# Altium footprint library texas.PCBLIB: 124 footprints (part 6 of 12) (continued)
## HTSSOP64DCA [mm] (continued)
  rectangle: 0.095,-4.305 0.405,-3.195
  rectangle: 0.595,-4.305 0.905,-3.195
  rectangle: 1.095,-4.305 1.405,-3.195
  rectangle: 1.595,-4.305 1.905,-3.195
  rectangle: 2.095,-4.305 2.405,-3.195
  rectangle: 2.595,-4.305 2.905,-3.195
  rectangle: 3.095,-4.305 3.405,-3.195
  rectangle: 3.595,-4.305 3.905,-3.195
  rectangle: 4.095,-4.305 4.405,-3.195
  rectangle: 4.595,-4.305 4.905,-3.195
  rectangle: 5.095,-4.305 5.405,-3.195
  rectangle: 5.595,-4.305 5.905,-3.195
  rectangle: 6.095,-4.305 6.405,-3.195
  rectangle: 6.595,-4.305 6.905,-3.195
  rectangle: 7.095,-4.305 7.405,-3.195
  rectangle: 7.595,-4.305 7.905,-3.195
  region: 7.905,4.305 7.595,4.305 7.595,3.195 7.905,3.195
  region: 7.405,4.305 7.095,4.305 7.095,3.195 7.405,3.195
  region: 6.905,4.305 6.595,4.305 6.595,3.195 6.905,3.195
  region: 6.405,4.305 6.095,4.305 6.095,3.195 6.405,3.195
  region: 5.905,4.305 5.595,4.305 5.595,3.195 5.905,3.195
  region: 5.405,4.305 5.095,4.305 5.095,3.195 5.405,3.195
  region: 4.905,4.305 4.595,4.305 4.595,3.195 4.905,3.195
  region: 4.405,4.305 4.095,4.305 4.095,3.195 4.405,3.195
  region: 3.905,4.305 3.595,4.305 3.595,3.195 3.905,3.195
  region: 3.405,4.305 3.095,4.305 3.095,3.195 3.405,3.195
  region: 2.905,4.305 2.595,4.305 2.595,3.195 2.905,3.195
  region: 2.405,4.305 2.095,4.305 2.095,3.195 2.405,3.195
  region: 1.905,4.305 1.595,4.305 1.595,3.195 1.905,3.195
  region: 1.405,4.305 1.095,4.305 1.095,3.195 1.405,3.195
  region: 0.905,4.305 0.595,4.305 0.595,3.195 0.905,3.195
  region: 0.405,4.305 0.095,4.305 0.095,3.195 0.405,3.195
  region: -0.095,4.305 -0.405,4.305 -0.405,3.195 -0.095,3.195
  region: -0.595,4.305 -0.905,4.305 -0.905,3.195 -0.595,3.195
  region: -1.095,4.305 -1.405,4.305 -1.405,3.195 -1.095,3.195
  region: -1.595,4.305 -1.905,4.305 -1.905,3.195 -1.595,3.195
  region: -2.095,4.305 -2.405,4.305 -2.405,3.195 -2.095,3.195
  region: -2.595,4.305 -2.905,4.305 -2.905,3.195 -2.595,3.195
  region: -3.095,4.305 -3.405,4.305 -3.405,3.195 -3.095,3.195
  region: -3.595,4.305 -3.905,4.305 -3.905,3.195 -3.595,3.195
  region: -4.095,4.305 -4.405,4.305 -4.405,3.195 -4.095,3.195
  region: -4.595,4.305 -4.905,4.305 -4.905,3.195 -4.595,3.195
  region: -5.095,4.305 -5.405,4.305 -5.405,3.195 -5.095,3.195
  region: -5.595,4.305 -5.905,4.305 -5.905,3.195 -5.595,3.195
  region: -6.095,4.305 -6.405,4.305 -6.405,3.195 -6.095,3.195
  region: -6.595,4.305 -6.905,4.305 -6.905,3.195 -6.595,3.195
  region: -7.095,4.305 -7.405,4.305 -7.405,3.195 -7.095,3.195
  region: -7.595,4.305 -7.905,4.305 -7.905,3.195 -7.595,3.195
  rectangle: -8.5,-2.55 8.5,2.54
Mechanical 2:
  circle w0.102: c-7.6,-2.2 r0.283
  lines w0.102: -8.5,-3.05 8.5,-3.05 8.5,3.05 -8.5,3.05 -8.5,-3.05
Mechanical 18:
  rectangle: -7.86,-4.15 -7.63,-3.095
  rectangle: -7.36,-4.15 -7.13,-3.095
  rectangle: -6.86,-4.15 -6.63,-3.095
  rectangle: -6.36,-4.15 -6.13,-3.095
  rectangle: -5.86,-4.15 -5.63,-3.095
  rectangle: -5.36,-4.15 -5.13,-3.095
  rectangle: -4.86,-4.15 -4.63,-3.095
  rectangle: -4.36,-4.15 -4.13,-3.095
  rectangle: -3.86,-4.15 -3.63,-3.095
  rectangle: -3.36,-4.15 -3.13,-3.095
  rectangle: -2.86,-4.15 -2.63,-3.095
  rectangle: -2.36,-4.15 -2.13,-3.095
  rectangle: -1.86,-4.15 -1.63,-3.095
  rectangle: -1.36,-4.15 -1.13,-3.095
  rectangle: -0.86,-4.15 -0.63,-3.095
  rectangle: -0.36,-4.15 -0.13,-3.095
  rectangle: 0.14,-4.15 0.37,-3.095
  rectangle: 0.64,-4.15 0.87,-3.095
  rectangle: 1.14,-4.15 1.37,-3.095
  rectangle: 1.64,-4.15 1.87,-3.095
  rectangle: 2.14,-4.15 2.37,-3.095
  rectangle: 2.64,-4.15 2.87,-3.095
  rectangle: 3.14,-4.15 3.37,-3.095
  rectangle: 3.64,-4.15 3.87,-3.095
  rectangle: 4.14,-4.15 4.37,-3.095
  rectangle: 4.64,-4.15 4.87,-3.095
  rectangle: 5.14,-4.15 5.37,-3.095
  rectangle: 5.64,-4.15 5.87,-3.095
  rectangle: 6.14,-4.15 6.37,-3.095
  rectangle: 6.64,-4.15 6.87,-3.095
  rectangle: 7.14,-4.15 7.37,-3.095
  rectangle: 7.64,-4.15 7.87,-3.095
  region: 7.86,4.15 7.63,4.15 7.63,3.095 7.86,3.095
  region: 7.36,4.15 7.13,4.15 7.13,3.095 7.36,3.095
  region: 6.86,4.15 6.63,4.15 6.63,3.095 6.86,3.095
  region: 6.36,4.15 6.13,4.15 6.13,3.095 6.36,3.095
  region: 5.86,4.15 5.63,4.15 5.63,3.095 5.86,3.095
  region: 5.36,4.15 5.13,4.15 5.13,3.095 5.36,3.095
  region: 4.86,4.15 4.63,4.15 4.63,3.095 4.86,3.095
  region: 4.36,4.15 4.13,4.15 4.13,3.095 4.36,3.095
  region: 3.86,4.15 3.63,4.15 3.63,3.095 3.86,3.095
  region: 3.36,4.15 3.13,4.15 3.13,3.095 3.36,3.095
  region: 2.86,4.15 2.63,4.15 2.63,3.095 2.86,3.095
  region: 2.36,4.15 2.13,4.15 2.13,3.095 2.36,3.095
  region: 1.86,4.15 1.63,4.15 1.63,3.095 1.86,3.095
  region: 1.36,4.15 1.13,4.15 1.13,3.095 1.36,3.095
  region: 0.86,4.15 0.63,4.15 0.63,3.095 0.86,3.095
  region: 0.36,4.15 0.13,4.15 0.13,3.095 0.36,3.095
  region: -0.14,4.15 -0.37,4.15 -0.37,3.095 -0.14,3.095
  region: -0.64,4.15 -0.87,4.15 -0.87,3.095 -0.64,3.095
  region: -1.14,4.15 -1.37,4.15 -1.37,3.095 -1.14,3.095
  region: -1.64,4.15 -1.87,4.15 -1.87,3.095 -1.64,3.095
  region: -2.14,4.15 -2.37,4.15 -2.37,3.095 -2.14,3.095
  region: -2.64,4.15 -2.87,4.15 -2.87,3.095 -2.64,3.095
  region: -3.14,4.15 -3.37,4.15 -3.37,3.095 -3.14,3.095
  region: -3.64,4.15 -3.87,4.15 -3.87,3.095 -3.64,3.095
  region: -4.14,4.15 -4.37,4.15 -4.37,3.095 -4.14,3.095
  region: -4.64,4.15 -4.87,4.15 -4.87,3.095 -4.64,3.095
  region: -5.14,4.15 -5.37,4.15 -5.37,3.095 -5.14,3.095
  region: -5.64,4.15 -5.87,4.15 -5.87,3.095 -5.64,3.095
  region: -6.14,4.15 -6.37,4.15 -6.37,3.095 -6.14,3.095
  region: -6.64,4.15 -6.87,4.15 -6.87,3.095 -6.64,3.095
  region: -7.14,4.15 -7.37,4.15 -7.37,3.095 -7.14,3.095
  region: -7.64,4.15 -7.87,4.15 -7.87,3.095 -7.64,3.095

## HTSSOP64DFD [mm]
pads (66):
  rect 0.3x1.1 smd paste-0.55 mask-0.55: 1(-7.75,-3.75) 2(-7.25,-3.75) 3(-6.75,-3.75) 4(-6.25,-3.75) 5(-5.75,-3.75) 6(-5.25,-3.75) 7(-4.75,-3.75) 8(-4.25,-3.75) 9(-3.75,-3.75) 10(-3.25,-3.75) 11(-2.75,-3.75) 12(-2.25,-3.75) 13(-1.75,-3.75) 14(-1.25,-3.75) 15(-0.75,-3.75) 16(-0.25,-3.75) 17(0.25,-3.75) 18(0.75,-3.75) 19(1.25,-3.75) 20(1.75,-3.75) 21(2.25,-3.75) 22(2.75,-3.75) 23(3.25,-3.75) 24(3.75,-3.75) 25(4.25,-3.75) 26(4.75,-3.75) 27(5.25,-3.75) 28(5.75,-3.75) 29(6.25,-3.75) 30(6.75,-3.75) 31(7.25,-3.75) 32(7.75,-3.75) 33(7.75,3.75) 34(7.25,3.75) 35(6.75,3.75) 36(6.25,3.75) 37(5.75,3.75) 38(5.25,3.75) 39(4.75,3.75) 40(4.25,3.75) 41(3.75,3.75) 42(3.25,3.75) 43(2.75,3.75) 44(2.25,3.75) 45(1.75,3.75) 46(1.25,3.75) 47(0.75,3.75) 48(0.25,3.75) 49(-0.25,3.75) 50(-0.75,3.75) 51(-1.25,3.75) 52(-1.75,3.75) 53(-2.25,3.75) 54(-2.75,3.75) 55(-3.25,3.75) 56(-3.75,3.75) 57(-4.25,3.75) 58(-4.75,3.75) 59(-5.25,3.75) 60(-5.75,3.75) 61(-6.25,3.75) 62(-6.75,3.75) 63(-7.25,3.75) 64(-7.75,3.75)
  rect 8x4 smd paste-4 mask-4: EXP@1(-4,0) EXP@2(4,0)
Top Paste:
  rectangle: -7.89,-4.285 -7.61,-3.215
  rectangle: -7.39,-4.285 -7.11,-3.215
  rectangle: -6.89,-4.285 -6.61,-3.215
  rectangle: -6.39,-4.285 -6.11,-3.215
  rectangle: -5.89,-4.285 -5.61,-3.215
  rectangle: -5.39,-4.285 -5.11,-3.215
  rectangle: -4.89,-4.285 -4.61,-3.215
  rectangle: -4.39,-4.285 -4.11,-3.215
  rectangle: -3.89,-4.285 -3.61,-3.215
  rectangle: -3.39,-4.285 -3.11,-3.215
  rectangle: -2.89,-4.285 -2.61,-3.215
  rectangle: -2.39,-4.285 -2.11,-3.215
  rectangle: -1.89,-4.285 -1.61,-3.215
  rectangle: -1.39,-4.285 -1.11,-3.215
  rectangle: -0.89,-4.285 -0.61,-3.215
  rectangle: -0.39,-4.285 -0.11,-3.215
  rectangle: 0.11,-4.285 0.39,-3.215
  rectangle: 0.61,-4.285 0.89,-3.215
  rectangle: 1.11,-4.285 1.39,-3.215
  rectangle: 1.61,-4.285 1.89,-3.215
  rectangle: 2.11,-4.285 2.39,-3.215
  rectangle: 2.61,-4.285 2.89,-3.215
  rectangle: 3.11,-4.285 3.39,-3.215
  rectangle: 3.61,-4.285 3.89,-3.215
  rectangle: 4.11,-4.285 4.39,-3.215
  rectangle: 4.61,-4.285 4.89,-3.215
  rectangle: 5.11,-4.285 5.39,-3.215
  rectangle: 5.61,-4.285 5.89,-3.215
  rectangle: 6.11,-4.285 6.39,-3.215
  rectangle: 6.61,-4.285 6.89,-3.215
  rectangle: 7.11,-4.285 7.39,-3.215
  rectangle: 7.61,-4.285 7.89,-3.215
  region: 7.89,4.285 7.61,4.285 7.61,3.215 7.89,3.215
  region: 7.39,4.285 7.11,4.285 7.11,3.215 7.39,3.215
  region: 6.89,4.285 6.61,4.285 6.61,3.215 6.89,3.215
  region: 6.39,4.285 6.11,4.285 6.11,3.215 6.39,3.215
  region: 5.89,4.285 5.61,4.285 5.61,3.215 5.89,3.215
  region: 5.39,4.285 5.11,4.285 5.11,3.215 5.39,3.215
  region: 4.89,4.285 4.61,4.285 4.61,3.215 4.89,3.215
  region: 4.39,4.285 4.11,4.285 4.11,3.215 4.39,3.215
  region: 3.89,4.285 3.61,4.285 3.61,3.215 3.89,3.215
  region: 3.39,4.285 3.11,4.285 3.11,3.215 3.39,3.215
  region: 2.89,4.285 2.61,4.285 2.61,3.215 2.89,3.215
  region: 2.39,4.285 2.11,4.285 2.11,3.215 2.39,3.215
  region: 1.89,4.285 1.61,4.285 1.61,3.215 1.89,3.215
  region: 1.39,4.285 1.11,4.285 1.11,3.215 1.39,3.215
  region: 0.89,4.285 0.61,4.285 0.61,3.215 0.89,3.215
  region: 0.39,4.285 0.11,4.285 0.11,3.215 0.39,3.215
  region: -0.11,4.285 -0.39,4.285 -0.39,3.215 -0.11,3.215
  region: -0.61,4.285 -0.89,4.285 -0.89,3.215 -0.61,3.215
  region: -1.11,4.285 -1.39,4.285 -1.39,3.215 -1.11,3.215
  region: -1.61,4.285 -1.89,4.285 -1.89,3.215 -1.61,3.215
  region: -2.11,4.285 -2.39,4.285 -2.39,3.215 -2.11,3.215
  region: -2.61,4.285 -2.89,4.285 -2.89,3.215 -2.61,3.215
  region: -3.11,4.285 -3.39,4.285 -3.39,3.215 -3.11,3.215
  region: -3.61,4.285 -3.89,4.285 -3.89,3.215 -3.61,3.215
  region: -4.11,4.285 -4.39,4.285 -4.39,3.215 -4.11,3.215
  region: -4.61,4.285 -4.89,4.285 -4.89,3.215 -4.61,3.215
  region: -5.11,4.285 -5.39,4.285 -5.39,3.215 -5.11,3.215
  region: -5.61,4.285 -5.89,4.285 -5.89,3.215 -5.61,3.215
  region: -6.11,4.285 -6.39,4.285 -6.39,3.215 -6.11,3.215
  region: -6.61,4.285 -6.89,4.285 -6.89,3.215 -6.61,3.215
  region: -7.11,4.285 -7.39,4.285 -7.39,3.215 -7.11,3.215
  region: -7.61,4.285 -7.89,4.285 -7.89,3.215 -7.61,3.215
Top Solder:
  rectangle: -7.905,-4.305 -7.595,-3.195
  rectangle: -7.405,-4.305 -7.095,-3.195
  rectangle: -6.905,-4.305 -6.595,-3.195
  rectangle: -6.405,-4.305 -6.095,-3.195
  rectangle: -5.905,-4.305 -5.595,-3.195
  rectangle: -5.405,-4.305 -5.095,-3.195
  rectangle: -4.905,-4.305 -4.595,-3.195
  rectangle: -4.405,-4.305 -4.095,-3.195
  rectangle: -3.905,-4.305 -3.595,-3.195
  rectangle: -3.405,-4.305 -3.095,-3.195
  rectangle: -2.905,-4.305 -2.595,-3.195
  rectangle: -2.405,-4.305 -2.095,-3.195
  rectangle: -1.905,-4.305 -1.595,-3.195
  rectangle: -1.405,-4.305 -1.095,-3.195
  rectangle: -0.905,-4.305 -0.595,-3.195
  rectangle: -0.405,-4.305 -0.095,-3.195
  rectangle: 0.095,-4.305 0.405,-3.195
  rectangle: 0.595,-4.305 0.905,-3.195
  rectangle: 1.095,-4.305 1.405,-3.195
  rectangle: 1.595,-4.305 1.905,-3.195
  rectangle: 2.095,-4.305 2.405,-3.195
  rectangle: 2.595,-4.305 2.905,-3.195
  rectangle: 3.095,-4.305 3.405,-3.195
  rectangle: 3.595,-4.305 3.905,-3.195
  rectangle: 4.095,-4.305 4.405,-3.195
  rectangle: 4.595,-4.305 4.905,-3.195
  rectangle: 5.095,-4.305 5.405,-3.195
  rectangle: 5.595,-4.305 5.905,-3.195
  rectangle: 6.095,-4.305 6.405,-3.195
  rectangle: 6.595,-4.305 6.905,-3.195
  rectangle: 7.095,-4.305 7.405,-3.195
  rectangle: 7.595,-4.305 7.905,-3.195
  region: 7.905,4.305 7.595,4.305 7.595,3.195 7.905,3.195
  region: 7.405,4.305 7.095,4.305 7.095,3.195 7.405,3.195
  region: 6.905,4.305 6.595,4.305 6.595,3.195 6.905,3.195
  region: 6.405,4.305 6.095,4.305 6.095,3.195 6.405,3.195
  region: 5.905,4.305 5.595,4.305 5.595,3.195 5.905,3.195
  region: 5.405,4.305 5.095,4.305 5.095,3.195 5.405,3.195
  region: 4.905,4.305 4.595,4.305 4.595,3.195 4.905,3.195
  region: 4.405,4.305 4.095,4.305 4.095,3.195 4.405,3.195
  region: 3.905,4.305 3.595,4.305 3.595,3.195 3.905,3.195
  region: 3.405,4.305 3.095,4.305 3.095,3.195 3.405,3.195
  region: 2.905,4.305 2.595,4.305 2.595,3.195 2.905,3.195
  region: 2.405,4.305 2.095,4.305 2.095,3.195 2.405,3.195
  region: 1.905,4.305 1.595,4.305 1.595,3.195 1.905,3.195
  region: 1.405,4.305 1.095,4.305 1.095,3.195 1.405,3.195
  region: 0.905,4.305 0.595,4.305 0.595,3.195 0.905,3.195
  region: 0.405,4.305 0.095,4.305 0.095,3.195 0.405,3.195
  region: -0.095,4.305 -0.405,4.305 -0.405,3.195 -0.095,3.195
  region: -0.595,4.305 -0.905,4.305 -0.905,3.195 -0.595,3.195
  region: -1.095,4.305 -1.405,4.305 -1.405,3.195 -1.095,3.195
  region: -1.595,4.305 -1.905,4.305 -1.905,3.195 -1.595,3.195
  region: -2.095,4.305 -2.405,4.305 -2.405,3.195 -2.095,3.195
  region: -2.595,4.305 -2.905,4.305 -2.905,3.195 -2.595,3.195
  region: -3.095,4.305 -3.405,4.305 -3.405,3.195 -3.095,3.195
  region: -3.595,4.305 -3.905,4.305 -3.905,3.195 -3.595,3.195
  region: -4.095,4.305 -4.405,4.305 -4.405,3.195 -4.095,3.195
  region: -4.595,4.305 -4.905,4.305 -4.905,3.195 -4.595,3.195
  region: -5.095,4.305 -5.405,4.305 -5.405,3.195 -5.095,3.195
  region: -5.595,4.305 -5.905,4.305 -5.905,3.195 -5.595,3.195
  region: -6.095,4.305 -6.405,4.305 -6.405,3.195 -6.095,3.195
  region: -6.595,4.305 -6.905,4.305 -6.905,3.195 -6.595,3.195
  region: -7.095,4.305 -7.405,4.305 -7.405,3.195 -7.095,3.195
  region: -7.595,4.305 -7.905,4.305 -7.905,3.195 -7.595,3.195
  rectangle: -8,-2 8,2
Mechanical 2:
  circle w0.102: c-7.6,-2.2 r0.283
  lines w0.102: -8.5,-3.05 8.5,-3.05 8.5,3.05 -8.5,3.05 -8.5,-3.05
Mechanical 18:
  rectangle: -7.86,-4.15 -7.63,-3.095
  rectangle: -7.36,-4.15 -7.13,-3.095
  rectangle: -6.86,-4.15 -6.63,-3.095
  rectangle: -6.36,-4.15 -6.13,-3.095
  rectangle: -5.86,-4.15 -5.63,-3.095
  rectangle: -5.36,-4.15 -5.13,-3.095
  rectangle: -4.86,-4.15 -4.63,-3.095
  rectangle: -4.36,-4.15 -4.13,-3.095
  rectangle: -3.86,-4.15 -3.63,-3.095
  rectangle: -3.36,-4.15 -3.13,-3.095
  rectangle: -2.86,-4.15 -2.63,-3.095
  rectangle: -2.36,-4.15 -2.13,-3.095
  rectangle: -1.86,-4.15 -1.63,-3.095
  rectangle: -1.36,-4.15 -1.13,-3.095
  rectangle: -0.86,-4.15 -0.63,-3.095
  rectangle: -0.36,-4.15 -0.13,-3.095
  rectangle: 0.14,-4.15 0.37,-3.095
  rectangle: 0.64,-4.15 0.87,-3.095
  rectangle: 1.14,-4.15 1.37,-3.095
  rectangle: 1.64,-4.15 1.87,-3.095
  rectangle: 2.14,-4.15 2.37,-3.095
  rectangle: 2.64,-4.15 2.87,-3.095
  rectangle: 3.14,-4.15 3.37,-3.095
  rectangle: 3.64,-4.15 3.87,-3.095
  rectangle: 4.14,-4.15 4.37,-3.095
  rectangle: 4.64,-4.15 4.87,-3.095
  rectangle: 5.14,-4.15 5.37,-3.095
  rectangle: 5.64,-4.15 5.87,-3.095
  rectangle: 6.14,-4.15 6.37,-3.095
  rectangle: 6.64,-4.15 6.87,-3.095
  rectangle: 7.14,-4.15 7.37,-3.095
  rectangle: 7.64,-4.15 7.87,-3.095
  region: 7.86,4.15 7.63,4.15 7.63,3.095 7.86,3.095
  region: 7.36,4.15 7.13,4.15 7.13,3.095 7.36,3.095
  region: 6.86,4.15 6.63,4.15 6.63,3.095 6.86,3.095
  region: 6.36,4.15 6.13,4.15 6.13,3.095 6.36,3.095
  region: 5.86,4.15 5.63,4.15 5.63,3.095 5.86,3.095
  region: 5.36,4.15 5.13,4.15 5.13,3.095 5.36,3.095
  region: 4.86,4.15 4.63,4.15 4.63,3.095 4.86,3.095
  region: 4.36,4.15 4.13,4.15 4.13,3.095 4.36,3.095
  region: 3.86,4.15 3.63,4.15 3.63,3.095 3.86,3.095
  region: 3.36,4.15 3.13,4.15 3.13,3.095 3.36,3.095
  region: 2.86,4.15 2.63,4.15 2.63,3.095 2.86,3.095
  region: 2.36,4.15 2.13,4.15 2.13,3.095 2.36,3.095
  region: 1.86,4.15 1.63,4.15 1.63,3.095 1.86,3.095
  region: 1.36,4.15 1.13,4.15 1.13,3.095 1.36,3.095
  region: 0.86,4.15 0.63,4.15 0.63,3.095 0.86,3.095
  region: 0.36,4.15 0.13,4.15 0.13,3.095 0.36,3.095
  region: -0.14,4.15 -0.37,4.15 -0.37,3.095 -0.14,3.095
  region: -0.64,4.15 -0.87,4.15 -0.87,3.095 -0.64,3.095
  region: -1.14,4.15 -1.37,4.15 -1.37,3.095 -1.14,3.095
  region: -1.64,4.15 -1.87,4.15 -1.87,3.095 -1.64,3.095
  region: -2.14,4.15 -2.37,4.15 -2.37,3.095 -2.14,3.095
  region: -2.64,4.15 -2.87,4.15 -2.87,3.095 -2.64,3.095
  region: -3.14,4.15 -3.37,4.15 -3.37,3.095 -3.14,3.095
  region: -3.64,4.15 -3.87,4.15 -3.87,3.095 -3.64,3.095
  region: -4.14,4.15 -4.37,4.15 -4.37,3.095 -4.14,3.095
  region: -4.64,4.15 -4.87,4.15 -4.87,3.095 -4.64,3.095
  region: -5.14,4.15 -5.37,4.15 -5.37,3.095 -5.14,3.095
  region: -5.64,4.15 -5.87,4.15 -5.87,3.095 -5.64,3.095
  region: -6.14,4.15 -6.37,4.15 -6.37,3.095 -6.14,3.095
  region: -6.64,4.15 -6.87,4.15 -6.87,3.095 -6.64,3.095
  region: -7.14,4.15 -7.37,4.15 -7.37,3.095 -7.14,3.095
  region: -7.64,4.15 -7.87,4.15 -7.87,3.095 -7.64,3.095

## LP_O-PBCY-W3 [mil]
pads (3):
  round 55.12 hole 31.5: 1(-100,0) 2(0,0) 3(100,0)
Mechanical 2:
  lines w8: -95.47,34.45 cw(c0,-0.18) 95.47,34.45 ; -94.49,-37.4 ccw(c-11.79,-6.36) -82.68,-59.06 82.68,-59.06 ccw(c11.79,-6.36) 94.49,-37.4
Mechanical 18:
  lines w8: -82.68,-59.06 cw(c0,-0.1) 82.68,-59.06

## P-QFP48-7X7MM [mil]
pads (49):
  rrect100% 31.5x11.81 smd: 1(-132.87,108.27) 2(-132.87,88.58) 3(-132.87,68.9) 4(-132.87,49.21) 5(-132.87,29.53) 6(-132.87,9.84) 7(-132.87,-9.84) 8(-132.87,-29.53) 9(-132.87,-49.21) 10(-132.87,-68.9) 11(-132.87,-88.58) 12(-132.87,-108.27) 25(132.87,-108.27) 26(132.87,-88.58) 27(132.87,-68.9) 28(132.87,-49.21) 29(132.87,-29.53) 30(132.87,-9.84) 31(132.87,9.84) 32(132.87,29.53) 33(132.87,49.21) 34(132.87,68.9) 35(132.87,88.58) 36(132.87,108.27)
  rrect100% 11.81x31.5 smd: 13(-108.27,-132.87) 14(-88.58,-132.87) 15(-68.9,-132.87) 16(-49.21,-132.87) 17(-29.53,-132.87) 18(-9.84,-132.87) 19(9.84,-132.87) 20(29.53,-132.87) 21(49.21,-132.87) 22(68.9,-132.87) 23(88.58,-132.87) 24(108.27,-132.87) 37(108.27,132.87) 38(88.58,132.87) 39(68.9,132.87) 40(49.21,132.87) 41(29.53,132.87) 42(9.84,132.87) 43(-9.84,132.87) 44(-29.53,132.87) 45(-49.21,132.87) 46(-68.9,132.87) 47(-88.58,132.87) 48(-108.27,132.87)
  rect 196.85x196.85 smd: EXP(0,0)
Mechanical 6:
  circle w0: c-98.43,98.43 r13.52
Mechanical 18:
  rectangle: -137.8,0 0,137.8
  lines w8: -136.75,-136.75 136.75,-136.75 136.75,136.75 -136.75,136.75 -136.75,-136.75

## PAP_S-PQFP-G64 [mm]
pads (65):
  rect 1.6x0.3 smd mask-0.8: 1(-5.6,3.75) 2(-5.6,3.25) 3(-5.6,2.75) 4(-5.6,2.25) 5(-5.6,1.75) 6(-5.6,1.25) 7(-5.6,0.75) 8(-5.6,0.25) 9(-5.6,-0.25) 10(-5.6,-0.75) 11(-5.6,-1.25) 12(-5.6,-1.75) 13(-5.6,-2.25) 14(-5.6,-2.75) 15(-5.6,-3.25) 16(-5.6,-3.75) 33(5.6,-3.75) 34(5.6,-3.25) 35(5.6,-2.75) 36(5.6,-2.25) 37(5.6,-1.75) 38(5.6,-1.25) 39(5.6,-0.75) 40(5.6,-0.25) 41(5.6,0.25) 42(5.6,0.75) 43(5.6,1.25) 44(5.6,1.75) 45(5.6,2.25) 46(5.6,2.75) 47(5.6,3.25) 48(5.6,3.75)
  rect 0.3x1.6 smd mask-0.8: 17(-3.75,-5.6) 18(-3.25,-5.6) 19(-2.75,-5.6) 20(-2.25,-5.6) 21(-1.75,-5.6) 22(-1.25,-5.6) 23(-0.75,-5.6) 24(-0.25,-5.6) 25(0.25,-5.6) 26(0.75,-5.6) 27(1.25,-5.6) 28(1.75,-5.6) 29(2.25,-5.6) 30(2.75,-5.6) 31(3.25,-5.6) 32(3.75,-5.6) 49(3.75,5.6) 50(3.25,5.6) 51(2.75,5.6) 52(2.25,5.6) 53(1.75,5.6) 54(1.25,5.6) 55(0.75,5.6) 56(0.25,5.6) 57(-0.25,5.6) 58(-0.75,5.6) 59(-1.25,5.6) 60(-1.75,5.6) 61(-2.25,5.6) 62(-2.75,5.6) 63(-3.25,5.6) 64(-3.75,5.6)
  rect 8x8 smd paste-4 mask-4: EXP(0,0)
Top Paste:
  rectangle: -3.2,-3.175 3.2,3.2
Top Solder:
  rectangle: -6.45,3.575 -4.775,3.925
  rectangle: -6.45,3.075 -4.775,3.425
  rectangle: -6.45,2.575 -4.775,2.925
  rectangle: -6.45,2.075 -4.775,2.425
  rectangle: -6.45,1.575 -4.775,1.925
  rectangle: -6.45,1.075 -4.775,1.425
  rectangle: -6.45,0.575 -4.775,0.925
  rectangle: -6.45,0.075 -4.775,0.425
  rectangle: -6.45,-0.425 -4.775,-0.075
  rectangle: -6.45,-0.925 -4.775,-0.575
  rectangle: -6.45,-1.425 -4.775,-1.075
  rectangle: -6.45,-1.925 -4.775,-1.575
  rectangle: -6.45,-2.425 -4.775,-2.075
  rectangle: -6.45,-2.925 -4.775,-2.575
  rectangle: -6.45,-3.425 -4.775,-3.075
  rectangle: -6.45,-3.925 -4.775,-3.575
  region: -3.575,-6.45 -3.575,-4.775 -3.925,-4.775 -3.925,-6.45
  region: -3.075,-6.45 -3.075,-4.775 -3.425,-4.775 -3.425,-6.45
  region: -2.575,-6.45 -2.575,-4.775 -2.925,-4.775 -2.925,-6.45
  region: -2.075,-6.45 -2.075,-4.775 -2.425,-4.775 -2.425,-6.45
  region: -1.575,-6.45 -1.575,-4.775 -1.925,-4.775 -1.925,-6.45
  region: -1.075,-6.45 -1.075,-4.775 -1.425,-4.775 -1.425,-6.45
  region: -0.575,-6.45 -0.575,-4.775 -0.925,-4.775 -0.925,-6.45
  region: -0.075,-6.45 -0.075,-4.775 -0.425,-4.775 -0.425,-6.45
  region: 0.425,-6.45 0.425,-4.775 0.075,-4.775 0.075,-6.45
  region: 0.925,-6.45 0.925,-4.775 0.575,-4.775 0.575,-6.45
  region: 1.425,-6.45 1.425,-4.775 1.075,-4.775 1.075,-6.45
  region: 1.925,-6.45 1.925,-4.775 1.575,-4.775 1.575,-6.45
  region: 2.425,-6.45 2.425,-4.775 2.075,-4.775 2.075,-6.45
  region: 2.925,-6.45 2.925,-4.775 2.575,-4.775 2.575,-6.45
  region: 3.425,-6.45 3.425,-4.775 3.075,-4.775 3.075,-6.45
  region: 3.925,-6.45 3.925,-4.775 3.575,-4.775 3.575,-6.45
  region: 6.45,-3.575 4.775,-3.575 4.775,-3.925 6.45,-3.925
  region: 6.45,-3.075 4.775,-3.075 4.775,-3.425 6.45,-3.425
  region: 6.45,-2.575 4.775,-2.575 4.775,-2.925 6.45,-2.925
  region: 6.45,-2.075 4.775,-2.075 4.775,-2.425 6.45,-2.425
  region: 6.45,-1.575 4.775,-1.575 4.775,-1.925 6.45,-1.925
  region: 6.45,-1.075 4.775,-1.075 4.775,-1.425 6.45,-1.425
  region: 6.45,-0.575 4.775,-0.575 4.775,-0.925 6.45,-0.925
  region: 6.45,-0.075 4.775,-0.075 4.775,-0.425 6.45,-0.425
  region: 6.45,0.425 4.775,0.425 4.775,0.075 6.45,0.075
  region: 6.45,0.925 4.775,0.925 4.775,0.575 6.45,0.575
  region: 6.45,1.425 4.775,1.425 4.775,1.075 6.45,1.075
  region: 6.45,1.925 4.775,1.925 4.775,1.575 6.45,1.575
  region: 6.45,2.425 4.775,2.425 4.775,2.075 6.45,2.075
  region: 6.45,2.925 4.775,2.925 4.775,2.575 6.45,2.575
  region: 6.45,3.425 4.775,3.425 4.775,3.075 6.45,3.075
  region: 6.45,3.925 4.775,3.925 4.775,3.575 6.45,3.575
  region: 3.575,6.45 3.575,4.775 3.925,4.775 3.925,6.45
  region: 3.075,6.45 3.075,4.775 3.425,4.775 3.425,6.45
  region: 2.575,6.45 2.575,4.775 2.925,4.775 2.925,6.45
  region: 2.075,6.45 2.075,4.775 2.425,4.775 2.425,6.45
  region: 1.575,6.45 1.575,4.775 1.925,4.775 1.925,6.45
  region: 1.075,6.45 1.075,4.775 1.425,4.775 1.425,6.45
  region: 0.575,6.45 0.575,4.775 0.925,4.775 0.925,6.45
  region: 0.075,6.45 0.075,4.775 0.425,4.775 0.425,6.45
  region: -0.425,6.45 -0.425,4.775 -0.075,4.775 -0.075,6.45
  region: -0.925,6.45 -0.925,4.775 -0.575,4.775 -0.575,6.45
  region: -1.425,6.45 -1.425,4.775 -1.075,4.775 -1.075,6.45
  region: -1.925,6.45 -1.925,4.775 -1.575,4.775 -1.575,6.45
  region: -2.425,6.45 -2.425,4.775 -2.075,4.775 -2.075,6.45
  region: -2.925,6.45 -2.925,4.775 -2.575,4.775 -2.575,6.45
  region: -3.425,6.45 -3.425,4.775 -3.075,4.775 -3.075,6.45
  region: -3.925,6.45 -3.925,4.775 -3.575,4.775 -3.575,6.45
  rectangle: -4.025,-4.025 4.025,4.025
Mechanical 2:
  circle w0: c-4.25,4.25 r0.326
  lines w0.203: -4.71,-4.71 4.71,-4.71 4.71,4.72 -4.71,4.72 -4.71,-4.71
Mechanical 18:
  region: -5.9,3.9 -5.9,3.6 -4.95,3.6 -4.95,3.9
  region: -5.9,3.4 -5.9,3.1 -4.95,3.1 -4.95,3.4
  region: -5.9,2.9 -5.9,2.6 -4.95,2.6 -4.95,2.9
  region: -5.9,2.4 -5.9,2.1 -4.95,2.1 -4.95,2.4
  region: -5.9,1.9 -5.9,1.6 -4.95,1.6 -4.95,1.9
  region: -5.9,1.4 -5.9,1.1 -4.95,1.1 -4.95,1.4
  region: -5.9,0.9 -5.9,0.6 -4.95,0.6 -4.95,0.9
  region: -5.9,0.4 -5.9,0.1 -4.95,0.1 -4.95,0.4
  region: -5.9,-0.1 -5.9,-0.4 -4.95,-0.4 -4.95,-0.1
  region: -5.9,-0.6 -5.9,-0.9 -4.95,-0.9 -4.95,-0.6
  region: -5.9,-1.1 -5.9,-1.4 -4.95,-1.4 -4.95,-1.1
  region: -5.9,-1.6 -5.9,-1.9 -4.95,-1.9 -4.95,-1.6
  region: -5.9,-2.1 -5.9,-2.4 -4.95,-2.4 -4.95,-2.1
  region: -5.9,-2.6 -5.9,-2.9 -4.95,-2.9 -4.95,-2.6
  region: -5.9,-3.1 -5.9,-3.4 -4.95,-3.4 -4.95,-3.1
  region: -5.9,-3.6 -5.9,-3.9 -4.95,-3.9 -4.95,-3.6
  region: -3.9,-4.95 -3.9,-5.9 -3.6,-5.9 -3.6,-4.95
  region: -3.4,-4.95 -3.4,-5.9 -3.1,-5.9 -3.1,-4.95
  region: -2.9,-4.95 -2.9,-5.9 -2.6,-5.9 -2.6,-4.95
  region: -2.4,-4.95 -2.4,-5.9 -2.1,-5.9 -2.1,-4.95
  region: -1.9,-4.95 -1.9,-5.9 -1.6,-5.9 -1.6,-4.95
  region: -1.4,-4.95 -1.4,-5.9 -1.1,-5.9 -1.1,-4.95
  region: -0.9,-4.95 -0.9,-5.9 -0.6,-5.9 -0.6,-4.95
  region: -0.4,-4.95 -0.4,-5.9 -0.1,-5.9 -0.1,-4.95
  region: 0.1,-4.95 0.1,-5.9 0.4,-5.9 0.4,-4.95
  region: 0.6,-4.95 0.6,-5.9 0.9,-5.9 0.9,-4.95
  region: 1.1,-4.95 1.1,-5.9 1.4,-5.9 1.4,-4.95
  region: 1.6,-4.95 1.6,-5.9 1.9,-5.9 1.9,-4.95
  region: 2.1,-4.95 2.1,-5.9 2.4,-5.9 2.4,-4.95
  region: 2.6,-4.95 2.6,-5.9 2.9,-5.9 2.9,-4.95
  region: 3.1,-4.95 3.1,-5.9 3.4,-5.9 3.4,-4.95
  region: 3.6,-4.95 3.6,-5.9 3.9,-5.9 3.9,-4.95
  region: 4.95,-3.6 4.95,-3.9 5.9,-3.9 5.9,-3.6
  region: 4.95,-3.1 4.95,-3.4 5.9,-3.4 5.9,-3.1
  region: 4.95,-2.6 4.95,-2.9 5.9,-2.9 5.9,-2.6
  region: 4.95,-2.1 4.95,-2.4 5.9,-2.4 5.9,-2.1
  region: 4.95,-1.6 4.95,-1.9 5.9,-1.9 5.9,-1.6
  region: 4.95,-1.1 4.95,-1.4 5.9,-1.4 5.9,-1.1
  region: 4.95,-0.6 4.95,-0.9 5.9,-0.9 5.9,-0.6
  region: 4.95,-0.1 4.95,-0.4 5.9,-0.4 5.9,-0.1
  region: 4.95,0.4 4.95,0.1 5.9,0.1 5.9,0.4
  region: 4.95,0.9 4.95,0.6 5.9,0.6 5.9,0.9
  region: 4.95,1.4 4.95,1.1 5.9,1.1 5.9,1.4
  region: 4.95,1.9 4.95,1.6 5.9,1.6 5.9,1.9
  region: 4.95,2.4 4.95,2.1 5.9,2.1 5.9,2.4
  region: 4.95,2.9 4.95,2.6 5.9,2.6 5.9,2.9
  region: 4.95,3.4 4.95,3.1 5.9,3.1 5.9,3.4
  region: 4.95,3.9 4.95,3.6 5.9,3.6 5.9,3.9
  region: 3.6,5.9 3.6,4.95 3.9,4.95 3.9,5.9
  region: 3.1,5.9 3.1,4.95 3.4,4.95 3.4,5.9
  region: 2.6,5.9 2.6,4.95 2.9,4.95 2.9,5.9
  region: 2.1,5.9 2.1,4.95 2.4,4.95 2.4,5.9
  region: 1.6,5.9 1.6,4.95 1.9,4.95 1.9,5.9
  region: 1.1,5.9 1.1,4.95 1.4,4.95 1.4,5.9
  region: 0.6,5.9 0.6,4.95 0.9,4.95 0.9,5.9
  region: 0.1,5.9 0.1,4.95 0.4,4.95 0.4,5.9
  region: -0.4,5.9 -0.4,4.95 -0.1,4.95 -0.1,5.9
  region: -0.9,5.9 -0.9,4.95 -0.6,4.95 -0.6,5.9
  region: -1.4,5.9 -1.4,4.95 -1.1,4.95 -1.1,5.9
  region: -1.9,5.9 -1.9,4.95 -1.6,4.95 -1.6,5.9
  region: -2.4,5.9 -2.4,4.95 -2.1,4.95 -2.1,5.9
  region: -2.9,5.9 -2.9,4.95 -2.6,4.95 -2.6,5.9
  region: -3.4,5.9 -3.4,4.95 -3.1,4.95 -3.1,5.9
  region: -3.9,5.9 -3.9,4.95 -3.6,4.95 -3.6,5.9
  lines w0.203: -4.91,-4.91 -4.91,4.91 4.91,4.91 4.91,-4.91 -4.91,-4.91